# Altium footprint library Connectors.PcbLib: 158 footprints (part 3 of 10)
Each footprint in its own frame and in the unit in brackets; x right, y up, seen from the top. Pads: shape width x height; smd on the part's side, far side on the other; paste and mask are expansions set on the pad; w line width, h text height; cw(c..) or ccw(c..) is an arc to the next point about the centre after c.
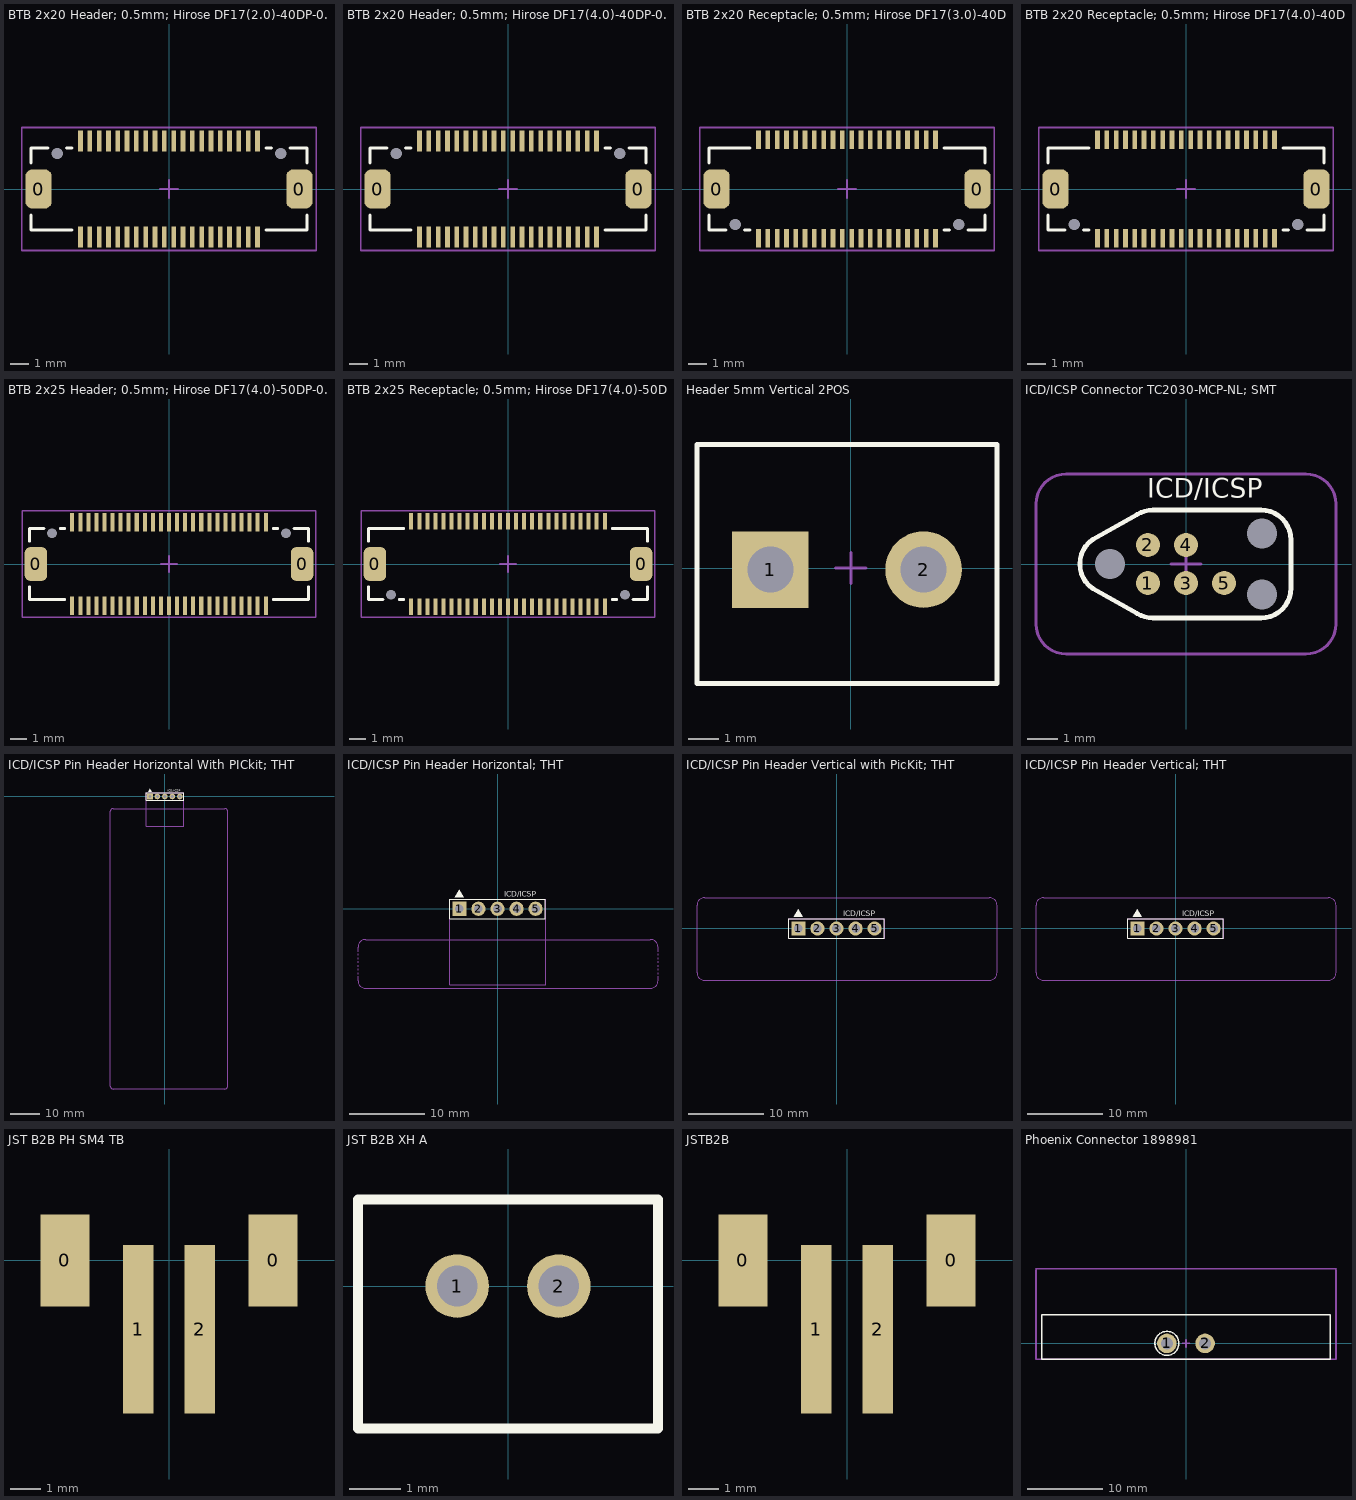
[diagram p2: the footprints below, top view; thin cyan lines are the x and y axes]

## BTB 2x20 Header; 0.5mm; Hirose DF17(2.0)-40DP-0.5V(57); SMT [mm]
pads (44):
  rrect50% 1.4x2.1 smd: 0(-7,0) 0(7,0)
  rect 0.25x1.15 smd: 1(-4.75,-2.575) 2(-4.75,2.575) 3(-4.25,-2.575) 4(-4.25,2.575) 5(-3.75,-2.575) 6(-3.75,2.575) 7(-3.25,-2.575) 8(-3.25,2.575) 9(-2.75,-2.575) 10(-2.75,2.575) 11(-2.25,-2.575) 12(-2.25,2.575) 13(-1.75,-2.575) 14(-1.75,2.575) 15(-1.25,-2.575) 16(-1.25,2.575) 17(-0.75,-2.575) 18(-0.75,2.575) 19(-0.25,-2.575) 20(-0.25,2.575) 21(0.25,-2.575) 22(0.25,2.575) 23(0.75,-2.575) 24(0.75,2.575) 25(1.25,-2.575) 26(1.25,2.575) 27(1.75,-2.575) 28(1.75,2.575) 29(2.25,-2.575) 30(2.25,2.575) 31(2.75,-2.575) 32(2.75,2.575) 33(3.25,-2.575) 34(3.25,2.575) 35(3.75,-2.575) 36(3.75,2.575) 37(4.25,-2.575) 38(4.25,2.575) 39(4.75,-2.575) 40(4.75,2.575)
  round 0.55 hole 0.6 unplated mask+0: ""(-6,1.9) ""(6,1.9)
Top Overlay:
  lines w0.16: -7.4,-1.4 -7.4,-2.2 -5.2,-2.2 ; -7.4,1.4 -7.4,2.2 -6.5,2.2 ; -5.5,2.2 -5.2,2.2 ; 5.2,-2.2 7.4,-2.2 7.4,-1.4 ; 5.2,2.2 5.5,2.2 ; 6.5,2.2 7.4,2.2 7.4,1.4
Mechanical 15:
  lines w0.1: -0.5,0 0.5,0 ; 0,-0.5 0,0.5 ; -7.9,-3.3 -7.9,3.3 7.9,3.3 7.9,-3.3 -7.9,-3.3
3D body "BTB 2x20 Header; 0.5mm; Hirose DF17(2.0)-40DP-0.5V(57); SMT.stp": height 4.3, standoff -0.6, extent -7.5,-2.85 7.5,2.85

## BTB 2x20 Header; 0.5mm; Hirose DF17(4.0)-40DP-0.5V(57); SMT [mm]
pads (44):
  rrect50% 1.4x2.1 smd: 0(-7,0) 0(7,0)
  rect 0.25x1.15 smd: 1(-4.75,-2.575) 2(-4.75,2.575) 3(-4.25,-2.575) 4(-4.25,2.575) 5(-3.75,-2.575) 6(-3.75,2.575) 7(-3.25,-2.575) 8(-3.25,2.575) 9(-2.75,-2.575) 10(-2.75,2.575) 11(-2.25,-2.575) 12(-2.25,2.575) 13(-1.75,-2.575) 14(-1.75,2.575) 15(-1.25,-2.575) 16(-1.25,2.575) 17(-0.75,-2.575) 18(-0.75,2.575) 19(-0.25,-2.575) 20(-0.25,2.575) 21(0.25,-2.575) 22(0.25,2.575) 23(0.75,-2.575) 24(0.75,2.575) 25(1.25,-2.575) 26(1.25,2.575) 27(1.75,-2.575) 28(1.75,2.575) 29(2.25,-2.575) 30(2.25,2.575) 31(2.75,-2.575) 32(2.75,2.575) 33(3.25,-2.575) 34(3.25,2.575) 35(3.75,-2.575) 36(3.75,2.575) 37(4.25,-2.575) 38(4.25,2.575) 39(4.75,-2.575) 40(4.75,2.575)
  round 0.55 hole 0.6 unplated mask+0: ""(-6,1.9) ""(6,1.9)
Top Overlay:
  lines w0.16: -7.4,-1.4 -7.4,-2.2 -5.2,-2.2 ; -7.4,1.4 -7.4,2.2 -6.5,2.2 ; -5.5,2.2 -5.2,2.2 ; 5.2,-2.2 7.4,-2.2 7.4,-1.4 ; 5.2,2.2 5.5,2.2 ; 6.5,2.2 7.4,2.2 7.4,1.4
Mechanical 15:
  lines w0.1: -0.5,0 0.5,0 ; 0,-0.5 0,0.5 ; -7.9,-3.3 -7.9,3.3 7.9,3.3 7.9,-3.3 -7.9,-3.3
3D body "BTB 2x20 Header; 0.5mm; Hirose DF17(4.0)-40DP-0.5V(57); SMT.stp": height 6.29, standoff -0.61, extent -7.5,-2.85 7.5,2.85

## BTB 2x20 Receptacle; 0.5mm; Hirose DF17(3.0)-40DS-0.5V(57); SMT [mm]
pads (44):
  rrect50% 1.4x2.1 smd: 0(-7,0) 0(7,0)
  rect 0.25x1 smd: 1(-4.75,-2.65) 2(-4.75,2.65) 3(-4.25,-2.65) 4(-4.25,2.65) 5(-3.75,-2.65) 6(-3.75,2.65) 7(-3.25,-2.65) 8(-3.25,2.65) 9(-2.75,-2.65) 10(-2.75,2.65) 11(-2.25,-2.65) 12(-2.25,2.65) 13(-1.75,-2.65) 14(-1.75,2.65) 15(-1.25,-2.65) 16(-1.25,2.65) 17(-0.75,-2.65) 18(-0.75,2.65) 19(-0.25,-2.65) 20(-0.25,2.65) 21(0.25,-2.65) 22(0.25,2.65) 23(0.75,-2.65) 24(0.75,2.65) 25(1.25,-2.65) 26(1.25,2.65) 27(1.75,-2.65) 28(1.75,2.65) 29(2.25,-2.65) 30(2.25,2.65) 31(2.75,-2.65) 32(2.75,2.65) 33(3.25,-2.65) 34(3.25,2.65) 35(3.75,-2.65) 36(3.75,2.65) 37(4.25,-2.65) 38(4.25,2.65) 39(4.75,-2.65) 40(4.75,2.65)
  round 0.55 hole 0.6 unplated mask+0: ""(-6,-1.9) ""(6,-1.9)
Top Overlay:
  lines w0.16: -7.4,-1.4 -7.4,-2.2 -6.5,-2.2 ; -7.4,1.4 -7.4,2.2 -5.2,2.2 ; -5.5,-2.2 -5.2,-2.2 ; 5.2,-2.2 5.5,-2.2 ; 5.2,2.2 7.4,2.2 7.4,1.4 ; 6.5,-2.2 7.4,-2.2 7.4,-1.4
Mechanical 15:
  lines w0.1: -0.5,0 0.5,0 ; 0,-0.5 0,0.5 ; -7.9,-3.3 7.9,-3.3 7.9,3.3 -7.9,3.3 -7.9,-3.3
3D body "BTB 2x20 Receptacle; 0.5mm; Hirose DF17(3.0)-40DS-0.5V(57); SMT.stp": height 3.5, standoff -0.6, extent -7.5,-2.85 7.5,2.85

## BTB 2x20 Receptacle; 0.5mm; Hirose DF17(4.0)-40DS-0.5V(57); SMT [mm]
pads (44):
  rrect50% 1.4x2.1 smd: 0(-7,0) 0(7,0)
  rect 0.25x1 smd: 1(-4.75,-2.65) 2(-4.75,2.65) 3(-4.25,-2.65) 4(-4.25,2.65) 5(-3.75,-2.65) 6(-3.75,2.65) 7(-3.25,-2.65) 8(-3.25,2.65) 9(-2.75,-2.65) 10(-2.75,2.65) 11(-2.25,-2.65) 12(-2.25,2.65) 13(-1.75,-2.65) 14(-1.75,2.65) 15(-1.25,-2.65) 16(-1.25,2.65) 17(-0.75,-2.65) 18(-0.75,2.65) 19(-0.25,-2.65) 20(-0.25,2.65) 21(0.25,-2.65) 22(0.25,2.65) 23(0.75,-2.65) 24(0.75,2.65) 25(1.25,-2.65) 26(1.25,2.65) 27(1.75,-2.65) 28(1.75,2.65) 29(2.25,-2.65) 30(2.25,2.65) 31(2.75,-2.65) 32(2.75,2.65) 33(3.25,-2.65) 34(3.25,2.65) 35(3.75,-2.65) 36(3.75,2.65) 37(4.25,-2.65) 38(4.25,2.65) 39(4.75,-2.65) 40(4.75,2.65)
  round 0.55 hole 0.6 unplated mask+0: ""(-6,-1.9) ""(6,-1.9)
Top Overlay:
  lines w0.16: -7.4,-1.4 -7.4,-2.2 -6.5,-2.2 ; -7.4,1.4 -7.4,2.2 -5.2,2.2 ; -5.5,-2.2 -5.2,-2.2 ; 5.2,-2.2 5.5,-2.2 ; 5.2,2.2 7.4,2.2 7.4,1.4 ; 6.5,-2.2 7.4,-2.2 7.4,-1.4
Mechanical 15:
  lines w0.1: -0.5,0 0.5,0 ; 0,-0.5 0,0.5 ; -7.9,-3.3 -7.9,3.3 7.9,3.3 7.9,-3.3 -7.9,-3.3
3D body "BTB 2x20 Receptacle; 0.5mm; Hirose DF17(4.0)-40DS-0.5V(57); SMT.stp": height 4.5, standoff -0.6, extent -7.5,-2.85 7.5,2.85

## BTB 2x25 Header; 0.5mm; Hirose DF17(4.0)-50DP-0.5V(57); SMT [mm]
pads (54):
  rrect50% 1.4x2.1 smd: 0(-8.25,0) 0(8.25,0)
  rect 0.25x1.15 smd: 1(-6,-2.575) 2(-6,2.575) 3(-5.5,-2.575) 4(-5.5,2.575) 5(-5,-2.575) 6(-5,2.575) 7(-4.5,-2.575) 8(-4.5,2.575) 9(-4,-2.575) 10(-4,2.575) 11(-3.5,-2.575) 12(-3.5,2.575) 13(-3,-2.575) 14(-3,2.575) 15(-2.5,-2.575) 16(-2.5,2.575) 17(-2,-2.575) 18(-2,2.575) 19(-1.5,-2.575) 20(-1.5,2.575) 21(-1,-2.575) 22(-1,2.575) 23(-0.5,-2.575) 24(-0.5,2.575) 25(0,-2.575) 26(0,2.575) 27(0.5,-2.575) 28(0.5,2.575) 29(1,-2.575) 30(1,2.575) 31(1.5,-2.575) 32(1.5,2.575) 33(2,-2.575) 34(2,2.575) 35(2.5,-2.575) 36(2.5,2.575) 37(3,-2.575) 38(3,2.575) 39(3.5,-2.575) 40(3.5,2.575) 41(4,-2.575) 42(4,2.575) 43(4.5,-2.575) 44(4.5,2.575) 45(5,-2.575) 46(5,2.575) 47(5.5,-2.575) 48(5.5,2.575) 49(6,-2.575) 50(6,2.575)
  round 0.55 hole 0.6 unplated mask+0: ""(-7.25,1.9) ""(7.25,1.9)
Top Overlay:
  lines w0.16: -8.65,-1.4 -8.65,-2.2 -6.475,-2.2 ; -8.65,1.4 -8.65,2.2 -7.75,2.2 ; -6.75,2.2 -6.475,2.2 ; 6.475,-2.2 8.65,-2.2 8.65,-1.4 ; 6.475,2.2 6.75,2.2 ; 7.75,2.2 8.65,2.2 8.65,1.4
Mechanical 15:
  lines w0.1: -0.5,0 0.5,0 ; 0,-0.5 0,0.5 ; -9.1,-3.3 -9.1,3.3 9.1,3.3 9.1,-3.3 -9.1,-3.3
3D body "BTB 2x25 Header; 0.5mm; Hirose DF17(4.0)-50DP-0.5V(57); SMT.stp": height 6.29, standoff -0.61, extent -8.75,-2.85 8.75,2.85

## BTB 2x25 Receptacle; 0.5mm; Hirose DF17(4.0)-50DS-0.5V(57); SMT [mm]
pads (54):
  rrect50% 1.4x2.1 smd: 0(-8.25,0) 0(8.25,0)
  rect 0.25x1 smd: 1(-6,-2.65) 2(-6,2.65) 3(-5.5,-2.65) 4(-5.5,2.65) 5(-5,-2.65) 6(-5,2.65) 7(-4.5,-2.65) 8(-4.5,2.65) 9(-4,-2.65) 10(-4,2.65) 11(-3.5,-2.65) 12(-3.5,2.65) 13(-3,-2.65) 14(-3,2.65) 15(-2.5,-2.65) 16(-2.5,2.65) 17(-2,-2.65) 18(-2,2.65) 19(-1.5,-2.65) 20(-1.5,2.65) 21(-1,-2.65) 22(-1,2.65) 23(-0.5,-2.65) 24(-0.5,2.65) 25(0,-2.65) 26(0,2.65) 27(0.5,-2.65) 28(0.5,2.65) 29(1,-2.65) 30(1,2.65) 31(1.5,-2.65) 32(1.5,2.65) 33(2,-2.65) 34(2,2.65) 35(2.5,-2.65) 36(2.5,2.65) 37(3,-2.65) 38(3,2.65) 39(3.5,-2.65) 40(3.5,2.65) 41(4,-2.65) 42(4,2.65) 43(4.5,-2.65) 44(4.5,2.65) 45(5,-2.65) 46(5,2.65) 47(5.5,-2.65) 48(5.5,2.65) 49(6,-2.65) 50(6,2.65)
  round 0.55 hole 0.6 unplated mask+0: ""(-7.25,-1.9) ""(7.25,-1.9)
Top Overlay:
  lines w0.16: -8.65,-1.4 -8.65,-2.2 -7.75,-2.2 ; -8.65,1.4 -8.65,2.2 -6.475,2.2 ; -6.75,-2.2 -6.475,-2.2 ; 6.475,-2.2 6.75,-2.2 ; 6.475,2.2 8.65,2.2 8.65,1.4 ; 7.75,-2.2 8.65,-2.2 8.65,-1.4
Mechanical 15:
  lines w0.1: -0.5,0 0.5,0 ; 0,-0.5 0,0.5 ; -9.1,-3.3 9.1,-3.3 9.1,3.3 -9.1,3.3 -9.1,-3.3
3D body "BTB 2x25 Receptacle; 0.5mm; Hirose DF17(4.0)-50DS-0.5V(57); SMT.stp": height 4.5, standoff -0.6, extent -8.75,-2.85 8.75,2.85

## Header 5mm Vertical 2POS [mm]
pads (2):
  rect 2.5x2.5 hole 1.5: 1(-2.625,-0.05)
  round 2.5 hole 1.5: 2(2.375,-0.05)
Top Overlay:
  lines w0.16: -5.025,-3.777 4.775,-3.777 4.775,4.042 -5.025,4.042 -5.025,-3.777
Mechanical 15:
  lines w0.1: -0.5,0 0.5,0 ; 0,-0.5 0,0.5
3D body "WÜRTH ELEKTRONIK - Terminal Block 5.00 mm - Header 2p.stp": height 12.1, standoff -3.9, extent -5.125,-3.85 4.875,4.65

## ICD/ICSP Connector TC2030-MCP-NL; SMT [mm]
pads (8):
  round 0.8 smd paste-0.4 mask+0.102: 1(-1.27,-0.635)
  round 0.8 smd paste-0.4: 2(-1.27,0.635) 3(0,-0.635) 4(0,0.635) 5(1.27,-0.635)
  round 0.95 hole 1 unplated mask+0: ""(-2.54,0) ""(2.54,-1.016) ""(2.54,1.016)
Top Overlay:
  lines w0.16: -3.111,-0.816 cw(c-2.544,0) -3.111,0.816 -1.63,1.648 cw(c-1.1,0.8) -1.1,1.8 2.5,1.8 cw(c2.5,0.8) 3.5,0.8 3.5,-0.8 cw(c2.5,-0.8) 2.5,-1.8 -1.1,-1.8 cw(c-1.1,-0.8) -1.63,-1.648 -3.111,-0.816
  text "ICD/ICSP" at -1.3,2.2 h0.65
Mechanical 15:
  lines w0.1: -0.5,0 0.5,0 ; 0,-0.5 0,0.5 ; -5,-2 ccw(c-4,-2) -4,-3 4,-3 ccw(c4,-2) 5,-2 5,2 ccw(c4,2) 4,3 -4,3 ccw(c-4,2) -5,2 -5,-2
3D body: height 5, standoff 0, extent -3.539,-1.801 3.501,1.801

## ICD/ICSP Pin Header Horizontal With PICkit; THT [mil]
pads (5):
  rect 75x75 hole 45: 1(-200,0)
  round 75 hole 45: 2(-100,0) 3(0,0) 4(100,0) 5(200,0)
Top Overlay:
  region: -223.62,61.02 -176.38,61.02 -200,100.39
  lines w6.3: -250.98,-51.18 -250.98,51.18 250.98,51.18 250.98,-51.18 -250.98,-51.18
  text "ICD/ICSP" at 34.45,63.98 h29.53
Mechanical 15:
  lines w3.94: -19.68,0 19.68,0 ; 0,-19.68 0,19.68 ; -732.28,-3881.89 ccw(c-692.91,-3881.89) -692.91,-3921.26 803.15,-3921.26 ccw(c803.15,-3881.89) 842.52,-3881.89 842.52,-200.79 ccw(c803.15,-200.79) 803.15,-161.42 -692.91,-161.42 ccw(c-692.91,-200.79) -732.28,-200.79 -732.28,-3881.89 ; -251.97,-397.64 -251.97,51.18 251.97,51.18 251.97,-397.64 -251.97,-397.64
3D body "Microchip PICkit3.step": height 251.97, standoff -220.47, extent -732.4,-3922.05 842.4,-162.21
3D body "pin_header_horizontal_male_100mil_1x5_THT.stp": height 101, standoff -117.11, extent -249.99,-396.21 250.01,11.66

## ICD/ICSP Pin Header Horizontal; THT [mil]
pads (5):
  rect 75x75 hole 45: 1(-200,0)
  round 75 hole 45: 2(-100,0) 3(0,0) 4(100,0) 5(200,0)
Top Overlay:
  region: -223.62,61.02 -176.38,61.02 -200,100.39
  lines w6.3: -250.98,-51.18 -250.98,51.18 250.98,51.18 250.98,-51.18 -250.98,-51.18
  text "ICD/ICSP" at 34.45,63.98 h29.53
Mechanical 15:
  lines w3.94: -732.28,-354.33 -732.28,-377.95 ccw(c-692.91,-377.95) -692.91,-417.32 803.15,-417.32 ccw(c803.15,-377.95) 842.52,-377.95 842.52,-354.33 ; -732.28,-342.52 -732.28,-334.65 ; -732.28,-322.83 -732.28,-314.96 ; -732.28,-303.15 -732.28,-295.28 ; -732.28,-283.46 -732.28,-275.59 ; -732.28,-263.78 -732.28,-255.91 ; -732.28,-244.09 -732.28,-236.22 ; -732.28,-224.41 -732.28,-200.79 cw(c-692.91,-200.79) -692.91,-161.42 803.15,-161.42 cw(c803.15,-200.79) 842.52,-200.79 842.52,-224.41 ; -19.68,0 19.68,0 ; 0,-19.68 0,19.68 ; 842.52,-342.52 842.52,-334.65 ; 842.52,-322.83 842.52,-314.96 ; 842.52,-303.15 842.52,-295.28 ; 842.52,-283.46 842.52,-275.59 ; 842.52,-263.78 842.52,-255.91 ; 842.52,-244.09 842.52,-236.22 ; -251.97,-397.64 -251.97,51.18 251.97,51.18 251.97,-397.64 -251.97,-397.64
3D body "pin_header_horizontal_male_100mil_1x5_THT.stp": height 101, standoff -117.11, extent -249.99,-396.21 250.01,11.66

## ICD/ICSP Pin Header Vertical with PicKit; THT [mil]
pads (5):
  rect 75x75 hole 45: 1(-200,0)
  round 75 hole 45: 2(-100,0) 3(0,0) 4(100,0) 5(200,0)
Top Overlay:
  region: -223.62,61.02 -176.38,61.02 -200,100.39
  lines w6.3: -250.98,-51.18 -250.98,51.18 250.98,51.18 250.98,-51.18 -250.98,-51.18
  text "ICD/ICSP" at 34.45,63.98 h29.53
Mechanical 15:
  lines w3.94: -19.68,0 19.68,0 ; 0,-19.68 0,19.68 ; -732.28,-232.28 ccw(c-692.91,-232.28) -692.91,-271.65 803.15,-271.65 ccw(c803.15,-232.28) 842.52,-232.28 842.52,122.05 ccw(c803.15,122.05) 803.15,161.42 -692.91,161.42 ccw(c-692.91,122.05) -732.28,122.05 -732.28,-232.28 ; -251.97,-51.18 -251.97,51.18 251.97,51.18 251.97,-51.18 -251.97,-51.18
3D body "Microchip PICkit3.step": height 3862.2, standoff 102.36, extent -732.4,-272.44 842.4,200
3D body "pin_header_vertical_male_100mil_1x5_THT.stp": height 337.22, standoff -117.11, extent -249.99,-49.99 250.01,50.01

## ICD/ICSP Pin Header Vertical; THT [mil]
pads (5):
  rect 75x75 hole 45: 1(-200,0)
  round 75 hole 45: 2(-100,0) 3(0,0) 4(100,0) 5(200,0)
Top Overlay:
  region: -223.62,61.02 -176.38,61.02 -200,100.39
  lines w6.3: -250.98,-51.18 250.98,-51.18 250.98,51.18 -250.98,51.18 -250.98,-51.18
  text "ICD/ICSP" at 34.45,63.98 h29.53
Mechanical 15:
  lines w3.94: -19.68,0 19.68,0 ; 0,-19.68 0,19.68 ; -732.28,-232.28 ccw(c-692.91,-232.28) -692.91,-271.65 803.15,-271.65 ccw(c803.15,-232.28) 842.52,-232.28 842.52,122.05 ccw(c803.15,122.05) 803.15,161.42 -692.91,161.42 ccw(c-692.91,122.05) -732.28,122.05 -732.28,-232.28 ; -251.97,-51.18 251.97,-51.18 251.97,51.18 -251.97,51.18 -251.97,-51.18
3D body "pin_header_vertical_male_100mil_1x5_THT.stp": height 337.22, standoff -117.11, extent -249.99,-49.99 250.01,50.01

## JST B2B PH SM4 TB [mm] "2 mm, 2 Contacts, Header, PH Series, Surface Mount, 1 Rows"
height 5
pads (4):
  rect 1.6x3 smd: 0(-3.4,0) 0(3.4,0)
  rect 1x5.5 smd: 1(-1,-2.25) 2(1,-2.25)
3D body "User Library-JST_B2B-PH-SM4-TB-white.step": height 6.6, standoff 0, extent -3.975,-4.5 3.975,2.5

## JST B2B XH A [mm] "JST 2 Pin Through hole"
height 7
pads (2):
  round 1.25 hole 0.8: 1(-1,0) 2(1,0)
Top Overlay:
  lines w0.2: -2.95,-2.8 2.95,-2.8 2.95,1.7 -2.95,1.7 -2.95,-2.8
3D body "User Library-JST B2B-PH-K-S.step": height 6, standoff -3.4, extent -2.95,-2.8 2.95,1.7

## JSTB2B [mm]
pads (4):
  rect 1.6x3 smd: 0(-3.4,0) 0(3.4,0)
  rect 1x5.5 smd: 1(-1,-2.25) 2(1,-2.25)
3D body "User Library-JST_B2B-PH-SM4-TB-white.step": height 6.6, standoff 0, extent -3.975,-4.5 3.975,2.5

## Phoenix Connector 1898981 [mm]
height 14.1
pads (2):
  round 2.6 hole 1.6: 1(-2.54,0) 2(2.54,0)
Top Overlay:
  circle w0.2: c-2.54,0 r1.6
  lines w0.2: -19.17,-2.1 19.17,-2.1 19.17,3.8 -19.17,3.8 -19.17,-2.1
Mechanical 15:
  lines w0.2: -19.96,9.8 -19.96,-2.1 19.96,-2.1 19.96,9.8 ; -19.96,9.9 19.96,9.9 ; -0.5,0 0.5,0 ; 0,-0.5 0,0.5
3D body "Phoenix Contact 1898981.stp": height 15.18, standoff -4.89, extent -20.897,-2.007 20.897,9.996